# Altium footprint library 3.08-SD、TF卡.PcbLib: 28 footprints (part 1 of 2)
Each footprint in its own frame and in the unit in brackets; x right, y up, seen from the top. Pads: shape width x height; smd on the part's side, far side on the other; paste and mask are expansions set on the pad; w line width, h text height; cw(c..) or ccw(c..) is an arc to the next point about the centre after c.
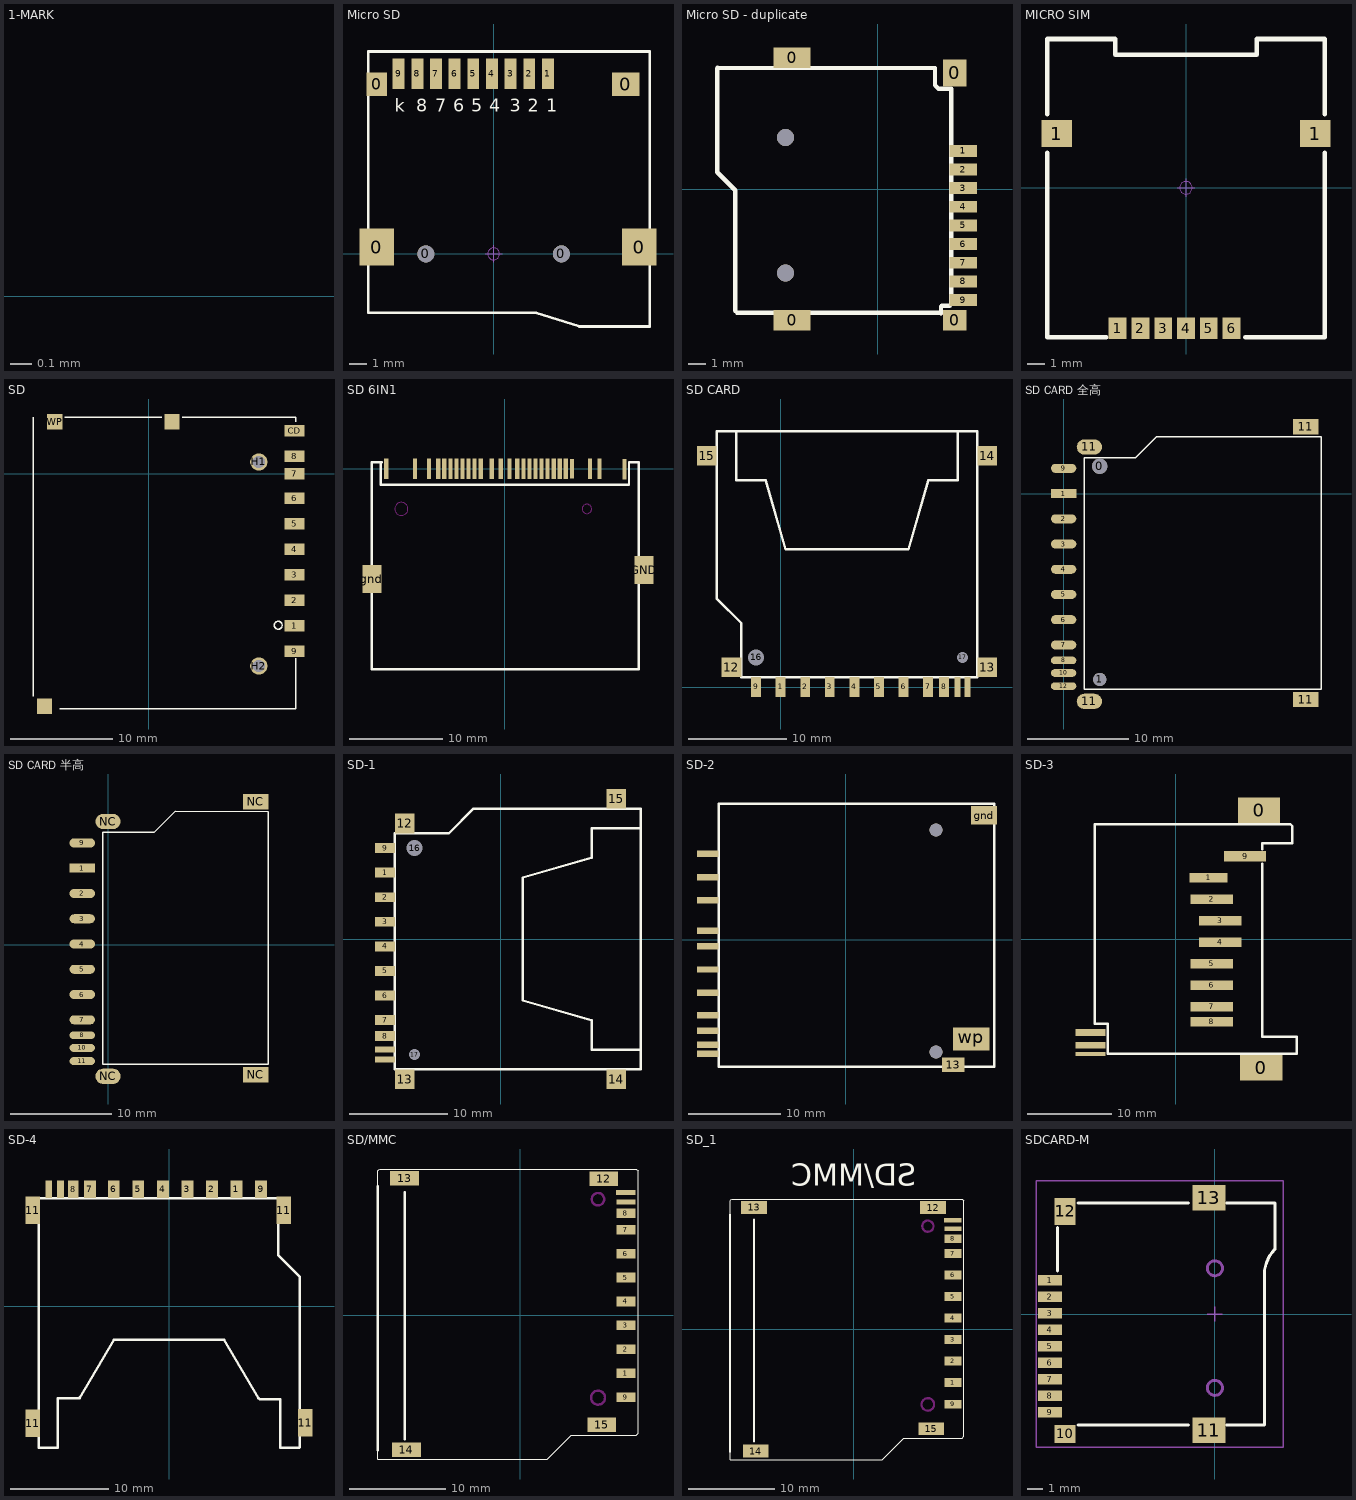
[diagram p0: the footprints below, top view; thin cyan lines are the x and y axes]

## 1-MARK [mm] "https://shop463601444.taobao.com"
Top Overlay:
  text "元件库封装库制作https://shop463601444.taobao.com" at -4.7,0.5 h0.7
  text "超低价原理图设计、PCB代画，布局合理，走线规范" at -4.5,-0.2 h0.7

## Micro SD [mm] "淘宝ID:黄晶宝石"
pads (15):
  rect 2.032x2.2 smd: 0(-6.9,0.4) 0(8.6,0.4)
  rect 1.2x1.4 smd: 0(-6.9,10)
  round 1 hole 1 unplated: 0(-4,0) 0(4,0)
  rect 1.6x1.4 smd: 0(7.8,10)
  rect 0.7x1.8 smd: 1(3.2,10.627) 2(2.1,10.627) 3(1,10.627) 4(-0.1,10.627) 5(-1.2,10.627) 6(-2.3,10.627) 7(-3.4,10.627) 8(-4.5,10.627) 9(-5.6,10.627)
Top Overlay:
  lines w0.152: 2.489,-3.47 5.054,-4.283 9.204,-4.283 9.204,11.938 -7.402,11.938 -7.402,-3.47 2.514,-3.47
  text "k" at -5.842,8.382 h0.76
  text "8" at -4.572,8.382 h0.76
  text "7" at -3.455,8.382 h0.76
  text "6" at -2.388,8.382 h0.76
  text "5" at -1.321,8.382 h0.76
  text "4" at -0.254,8.382 h0.76
  text "3" at 0.939,8.382 h0.76
  text "2" at 2.006,8.382 h0.76
  text "1" at 3.098,8.382 h0.76
Mechanical 15:
  circle w0.05: c0,0 r0.35
  lines w0.05: -0.5,0 0.5,0 ; 0,-0.5 0,0.5
3D body "TF 卡座-A.STE": height 2, standoff -0.45, extent -7.05,-4 8.95,11.25

## Micro SD - duplicate [mm]
pads (13):
  rect 2.2x1.2 smd: 0(-5.05,-7.75) 0(-5.05,7.75)
  rect 1.4x1.2 smd: 0(4.55,-7.75)
  rect 1.4x1.6 smd: 0(4.55,6.85)
  rect 1.6x0.7 smd: 1(5.05,2.25) 2(5.05,1.15) 3(5.05,0.05) 4(5.05,-1.05) 5(5.05,-2.15) 6(5.05,-3.25) 7(5.05,-4.35) 8(5.05,-5.45) 9(5.05,-6.55)
via -5.45,-4.95 diameter 1 hole 1
via -5.45,3.05 diameter 1 hole 1
Top Layer:
  lines w0.254: 3.688,-7.293 3.738,-7.344
Top Overlay:
  lines w0.254: -9.47,7.13 -9.47,0.988 -8.403,-0.079 -8.403,-7.191 -8.301,-7.293 3.688,-7.293 ; -9.45,7.15 3.383,7.134 3.383,6.118 3.586,5.915 4.348,5.915 4.348,-6.785 4.246,-6.886 3.789,-6.886 3.738,-6.937 3.738,-7.344

## MICRO SIM [mm] "16.30mm*14.66mm*1.8mm(长*宽*厚）"
pads (8):
  rect 1.7x1.5 smd: 1(-7.2,3.02) 1(7.2,3.02)
  rect 1x1.2 smd: 1(-3.81,-7.83) 2(-2.54,-7.83) 3(-1.27,-7.83) 4(0,-7.83) 5(1.27,-7.83) 6(2.54,-7.83)
Top Overlay:
  lines w0.254: -7.747,1.949 -7.747,-8.338 -4.445,-8.338 ; -7.747,4.108 -7.747,8.299 -3.937,8.299 -3.937,7.41 3.937,7.41 3.937,8.299 7.747,8.299 7.747,4.108 ; 3.302,-8.338 7.747,-8.338 7.747,1.949
Mechanical 15:
  circle w0.05: c0,0 r0.35
  lines w0.05: -0.5,0 0.5,0 ; 0,-0.5 0,0.5
3D body "MICRO SIM.STEP": height 1.85, standoff 0.04, extent -7.58,-8.13 7.58,8.13

## SD [mm] "淘宝ID:黄晶宝石"
pads (15):
  rect 2x1.1 smd: 1(14.3,-14.899) 2(14.3,-12.399) 3(14.3,-9.899) 4(14.3,-7.399) 5(14.3,-4.899) 6(14.3,-2.399) 7(14.3,0.001) 8(14.3,1.701) 9(14.3,-17.399) CD(14.3,4.201)
  rect 1.5x1.5 smd: GND1(2.3,5.101) GND2(-10.2,-22.799) WP(-9.2,5.101)
  round 1.7 hole 1.2 unplated: H1(10.8,1.151) H2(10.8,-18.849)
Top Overlay:
  circle w0.127: c12.705,-14.851 r0.39
  lines w0.127: -11.3,-21.821 -11.3,5.551 ; -8.7,-23.049 14.4,-23.049 14.4,-18.099 ; -8.2,5.551 1.3,5.551 ; 3.3,5.551 14.4,5.551 14.4,5.101

## SD 6IN1 [mm] "淘宝ID:黄晶宝石"
pads (29):
  rect 0.45x2.2 smd: 1(-9.636,-0.007) 2(-8.136,-0.007) 3(-7.136,-0.007) 4(-6.486,-0.007) 5(-5.836,-0.007) 6(-5.186,-0.007) 7(-4.536,-0.007) 8(-3.886,-0.007) 9(-3.236,-0.007) 10(-2.586,-0.007) 11(-1.396,-0.007) 12(-0.446,-0.007) 13(0.504,-0.007) 14(1.34,-0.007) 15(1.99,-0.007) 16(2.64,-0.007) 17(3.29,-0.007) 18(3.94,-0.007) 19(4.59,-0.007) 20(5.24,-0.007) 24(9.134,-0.007) 25(10.164,-0.007) 25(12.824,-0.058) 26(-12.716,-0.007)
  rect 0.44x2.2 smd: 21(5.89,-0.007) 22(6.54,-0.007)
  rect 0.45x2.1 smd: 23(7.19,-0.007)
  rect 2x3 smd: gnd(-14.246,-11.833) GND(14.929,-10.883)
Top Overlay:
  lines w0.254: -13.408,0.704 -13.306,0.704 ; -13.179,0.704 -14.271,0.704 -14.271,-21.521 14.354,-21.521 14.354,0.704 13.643,0.704 13.313,0.704 13.313,-1.709 -13.306,-1.709 ; -13.306,-1.709 -13.306,0.704 ; -13.306,-1.709 -13.306,0.704
Keep-Out Layer:
  lines w0.1: -11.796,-4.307 ccw(c-11.096,-4.307) -10.396,-4.307 ccw(c-11.096,-4.307) -11.796,-4.307 ; 8.304,-4.307 ccw(c8.804,-4.307) 9.304,-4.307 ccw(c8.804,-4.307) 8.304,-4.307

## SD CARD [mm] "淘宝ID:黄晶宝石"
pads (17):
  rect 1x2 smd: 1(0.007,0.016) 2(2.507,0.016) 3(5.007,0.016) 4(7.507,0.016) 5(10.007,0.016) 6(12.507,0.016) 7(15.007,0.016) 8(16.632,0.016) 9(-2.493,0.016)
  rect 0.6x2 smd: 10(19.007,0.016) 11(18.007,0.016)
  rect 2x2 smd: 12(-4.993,2.016) 13(21.007,2.016) 14(21.007,23.516) 15(-7.493,23.516)
  round 1.5 hole 1.6: 16(-2.493,3.016)
  round 1 hole 1.1: 17(18.507,3.016)
Top Overlay:
  lines w0.254: -4.493,26.016 -4.493,21.016 -1.493,21.016 0.507,14.016 13.007,14.016 15.007,21.016 18.007,21.016 18.007,26.016 ; -6.493,9.016 -3.993,6.516 -3.993,1.016 20.007,1.016 20.007,26.016 -6.493,26.016 -6.493,9.016

## SD CARD 全高 [mil] "淘宝ID:黄晶宝石"
pads (17):
  round 59.06 hole 59.06: 0(140,106)
  rect 98.42x35 smd: 1(0,0)
  round 51.18 hole 51.18: 1(140,-722)
  oval 98.43x35 smd: 2(0,-98) 3(0,-196) 4(0,-294) 5(0,-392) 6(0,-490) 7(0,-588) 9(0,98)
  oval 98.42x30 smd: 8(0,-648) 10(0,-697) 12(0,-748)
  oval 98.42x59.05 smd: 11(100,-807.09) 11(100,181.1)
  rect 98.42x59.05 smd: 11(940,-800) 11(940,260)
Top Overlay:
  lines w6: 220,140 80,140 ; 780,220 1000,220 1000,-760 880,-760 ; 900,-760 80,-760 80,140 ; 900,220 360,220 280,140 80,140

## SD CARD 半高 [mm] "淘宝ID:黄晶宝石"
pads (15):
  rect 2.5x0.889 smd: 1(-2.54,7.518)
  oval 2.5x0.889 smd: 2(-2.54,5.029) 3(-2.54,2.54) 4(-2.54,0.051) 5(-2.54,-2.438) 6(-2.54,-4.928) 7(-2.54,-7.417) 9(-2.54,10.008)
  oval 2.5x0.762 smd: 8(-2.54,-8.941) 10(-2.54,-10.185) 11(-2.54,-11.481)
  oval 2.5x1.5 smd: NC(0,-12.982) NC(0,12.118)
  rect 2.5x1.5 smd: NC(14.55,-12.82) NC(14.55,14.07)
Top Layer:
  lines w0.254: -0.001,12.372 0.001,11.864
Top Overlay:
  lines w0.152: 3.048,11.074 -0.508,11.074 ; -0.508,11.074 -0.508,-11.786 15.761,-11.811 15.761,13.081 6.604,13.106 4.572,11.074 -0.508,11.074

## SD-1 [mm]
pads (17):
  rect 2x1 smd: 1(-11.75,6.75) 2(-11.75,4.25) 3(-11.75,1.75) 4(-11.75,-0.75) 5(-11.75,-3.25) 6(-11.75,-5.75) 7(-11.75,-8.25) 8(-11.75,-9.875) 9(-11.75,9.25)
  rect 2x0.6 smd: 10(-11.75,-12.25) 11(-11.75,-11.25)
  rect 2x2 smd: 12(-9.75,11.75) 13(-9.75,-14.25) 14(11.75,-14.25) 15(11.75,14.25)
  round 1.5 hole 1.6: 16(-8.75,9.25)
  round 1 hole 1.1: 17(-8.75,-11.75)
Top Overlay:
  lines w0.254: 14.25,-11.25 9.25,-11.25 9.25,-8.25 2.25,-6.25 2.25,6.25 9.25,8.25 9.25,11.25 14.25,11.25 ; -10.75,-13.25 -10.75,10.75 -5.25,10.75 -2.75,13.25 14.25,13.25 14.25,-13.25 -10.75,-13.25

## SD-2 [mm]
pads (14):
  rect 2.35x0.7 smd: 1(-14.935,6.8) 2(-14.935,4.3) 3(-14.935,1) 4(-14.935,-0.7) 5(-14.935,-3.2) 6(-14.935,-5.7) 7(-14.935,-8.13) 8(-14.935,-9.82) 9(-14.935,9.3) cd(-14.935,-11.32) com(-14.935,-12.32)
  rect 2.4x1.6 smd: 13(11.595,-13.5)
  rect 2.8x2 smd: gnd(14.935,13.5)
  rect 3.95x2.5 smd: wp(13.565,-10.7)
via 9.735,-12.1 diameter 1.4 hole 1.4
via 9.735,11.9 diameter 1.4 hole 1.4
Top Overlay:
  lines w0.254: -13.76,-13.72 -13.76,14.72 16.045,14.72 16.045,-13.72 -13.76,-13.72

## SD-3 [mm]
pads (14):
  rect 5x3 smd: 0(9.843,15.24) 0(10.097,-15.24)
  rect 4.5x1.143 smd: 1(3.874,7.239)
  rect 5x1.143 smd: 2(4.255,4.699) 3(5.271,2.159) 4(5.271,-0.381) 5(4.255,-2.921) 6(4.255,-5.461) 7(4.255,-8.001) 8(4.255,-9.779)
  rect 5x1.27 smd: 9(8.192,9.779)
  rect 3.556x0.8 smd: 10(-10.097,-11.049) 11(-10.097,-12.573)
  rect 3.556x0.5 smd: 12(-10.097,-13.589)
Top Overlay:
  lines w0.3: 7.683,-13.589 14.287,-13.589 14.287,-11.557 10.223,-11.557 10.223,8.889 ; 8.191,-13.589 -8.065,-13.589 -8.065,-10.033 -9.589,-10.033 -9.589,13.589 8.191,13.589 13.525,13.589 13.779,13.335 13.779,11.303 10.223,11.303 10.223,10.59

## SD-4 [mm]
pads (15):
  rect 1.2x1.8 smd: 1(6.858,11.917) 2(4.369,11.917) 3(1.875,11.908) 4(-0.625,11.908) 5(-3.125,11.908) 6(-5.625,11.908) 7(-8.05,11.908) 9(9.375,11.908)
  rect 1.1x1.8 smd: 8(-9.754,11.917)
  rect 0.7x1.8 smd: 10(-11.05,11.908) 12(-12.243,11.917)
  rect 1.5x2.8 smd: 11(-13.868,-11.917) 11(-13.868,9.774) 11(11.684,9.774) 11(13.868,-11.866)
Top Overlay:
  lines w0.254: -11.3,-9.383 -11.3,-14.383 -13.273,-14.383 -13.273,11.003 -13.259,11.017 11.1,11.017 11.1,5.207 13.289,3.018 13.3,3.018 13.3,-14.356 13.273,-14.383 11.3,-14.383 11.3,-9.484 9.258,-9.484 9.1,-9.326 ; -11.249,-9.377 -9.207,-9.377 -9.049,-9.219 ; -9.1,-9.377 -5.588,-3.383 ; -5.6,-3.383 5.6,-3.383 9.1,-9.377
Multi-Layer:
  circle w0.254: c-11.532,8.617 r0.58
  circle w0.254: c9.5,8.657 r0.82

## SD/MMC [mm] "淘宝ID:黄晶宝石"
pads (15):
  rect 2x1 smd: 1(11.042,-6.055) 2(11.042,-3.555) 3(11.042,-1.055) 4(11.042,1.445) 5(11.042,3.945) 6(11.042,6.445) 7(11.042,8.945) 8(11.042,10.645) 9(11.042,-8.555)
  rect 2x0.5 smd: 10(11.042,11.839) 11(11.017,12.83)
  rect 3x1.5 smd: 12(8.727,14.275) 13(-12.073,14.3) 14(-11.873,-14.025) 15(8.527,-11.425)
Top Overlay:
  lines w0.076: -14.873,12.675 -14.873,15.075 -14.773,15.175 -14.673,15.275 12.127,15.275 12.327,15.075 12.327,-12.325 12.127,-12.525 5.327,-12.525 2.827,-15.025 -14.873,-15.025 ; -14.873,14.775 -14.873,-15.025 ; -14.873,-15.025 -14.873,-15.025
  lines w0.254: -14.873,-14.1 -14.873,13.5 ; -12.073,-12.925 -12.073,12.875
Top Paste:
  circle w0.064: c-14.659,13.624 r0.032
Keep-Out Layer:
  circle w0.254: c8.127,-8.598 r0.727
  circle w0.254: c8.127,12.125 r0.65

## SD_1 [mm]
pads (15):
  rect 2x1 smd: 1(11.557,-6.192) 2(11.557,-3.692) 3(11.557,-1.192) 4(11.557,1.308) 5(11.557,3.808) 6(11.557,6.308) 7(11.557,8.808) 8(11.557,10.508) 9(11.557,-8.692)
  rect 2x0.5 smd: 10(11.557,11.702) 11(11.532,12.692)
  rect 3x1.5 smd: 12(9.243,14.138) 13(-11.557,14.162) 14(-11.357,-14.162) 15(9.042,-11.562)
Top Overlay:
  lines w0.076: -14.357,12.538 -14.357,14.938 -14.257,15.038 -14.157,15.138 12.643,15.138 12.843,14.938 12.843,-12.462 12.643,-12.662 5.842,-12.662 3.343,-15.162 -14.357,-15.162 ; -14.357,14.638 -14.357,-15.162 ; -14.357,-15.162 -14.357,-15.162
  lines w0.254: -14.357,-14.238 -14.357,13.362 ; -11.557,-13.062 -11.557,12.738
  text "SD/MMC" at 7.323,16.677 h2.54
Top Paste:
  circle w0.064: c-7.663,-0.501 r0.032
  circle w0.064: c-14.143,13.487 r0.032
  circle w0.064: c-10.156,-2.864 r0.032
  circle w0.064: c-5.17,-6.203 r0.032
  circle w0.064: c-9.178,-3.88 r0.032
  circle w0.064: c-6.148,-5.187 r0.032
Keep-Out Layer:
  circle w0.254: c8.643,-8.736 r0.727
  circle w0.254: c8.643,11.988 r0.65

## SDCARD-M [mm] "TF卡       淘宝ID:黄晶宝石"
height 1.5
pads (13):
  rect 1.6x0.7 smd: 1(-11.008,2.25) 2(-11.008,1.15) 3(-11.008,0.05) 4(-11.008,-1.05) 5(-11.008,-2.15) 6(-11.008,-3.25) 7(-11.008,-4.35) 8(-11.008,-5.45) 9(-11.008,-6.55)
  rect 1.4x1.2 smd: 10(-10,-8.004)
  rect 2.2x1.7 smd: 11(-0.4,-7.75) 13(-0.4,7.75)
  rect 1.4x1.8 smd: 12(-10,6.85)
Top Overlay:
  lines w0.2: -10.5,2.88 -10.5,5.756 ; -9.144,-7.4 -1.778,-7.4 ; -9.144,7.4 -1.778,7.4 ; 0.762,-7.4 3.3,-7.4 3.3,1.016 ; 0.762,7.4 4,7.4 4,4.318 ccw(c5.69,2.628) 3.3,2.628 3.3,0.762
Mechanical 1:
  circle w0.2: c0,3.05 r0.5
  circle w0.2: c0,-4.93 r0.5
Mechanical 15:
  lines w0.1: -0.5,0 0.5,0 ; 0,-0.5 0,0.5 ; -11.938,-8.89 -11.938,8.89 4.572,8.89 4.572,-8.89 -11.938,-8.89